# Altium footprint library micro-intel.PCBLIB: 48 footprints (part 2 of 4)
Each footprint in its own frame and in the unit in brackets; x right, y up, seen from the top. Pads: shape width x height; smd on the part's side, far side on the other; paste and mask are expansions set on the pad; w line width, h text height; cw(c..) or ccw(c..) is an arc to the next point about the centre after c.
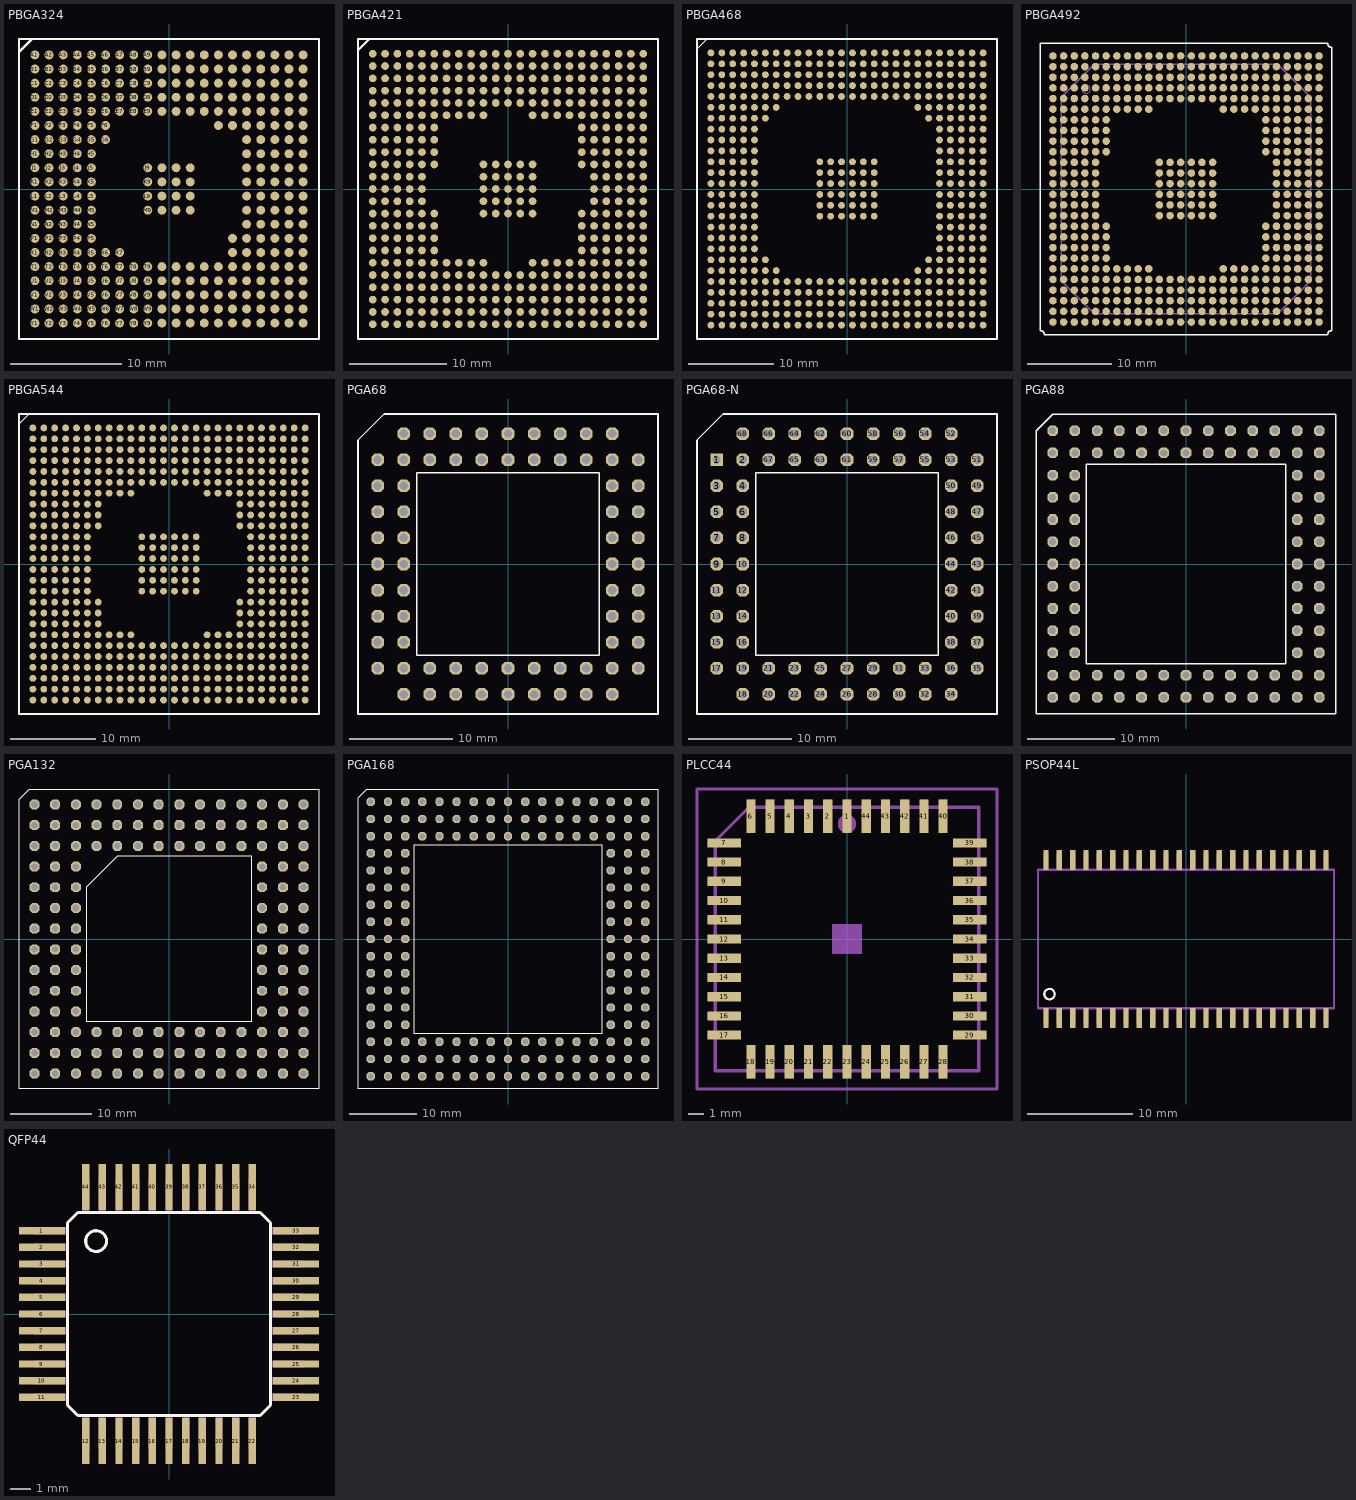
[diagram p1: the footprints below, top view; thin cyan lines are the x and y axes]

## PBGA324 [mil]
pads (324):
  rrect100% 31.5x31.5 smd: A1(-475,475) A2(-425,475) A3(-375,475) A4(-325,475) A5(-275,475) A6(-225,475) A7(-175,475) A8(-125,475) A9(-75,475) A10(-25,475) A11(25,475) A12(75,475) A13(125,475) A14(175,475) A15(225,475) A16(275,475) A17(325,475) A18(375,475) A19(425,475) A20(475,475) B1(-475,425) B2(-425,425) B3(-375,425) B4(-325,425) B5(-275,425) B6(-225,425) B7(-175,425) B8(-125,425) B9(-75,425) B10(-25,425) B11(25,425) B12(75,425) B13(125,425) B14(175,425) B15(225,425) B16(275,425) B17(325,425) B18(375,425) B19(425,425) B20(475,425) C1(-475,375) C2(-425,375) C3(-375,375) C4(-325,375) C5(-275,375) C6(-225,375) C7(-175,375) C8(-125,375) C9(-75,375) C10(-25,375) C11(25,375) C12(75,375) C13(125,375) C14(175,375) C15(225,375) C16(275,375) C17(325,375) C18(375,375) C19(425,375) C20(475,375) D1(-475,325) D2(-425,325) D3(-375,325) D4(-325,325) D5(-275,325) D6(-225,325) D7(-175,325) D8(-125,325) D9(-75,325) D10(-25,325) D11(25,325) D12(75,325) D13(125,325) D14(175,325) D15(225,325) D16(275,325) D17(325,325) D18(375,325) D19(425,325) D20(475,325) E1(-475,275) E2(-425,275) E3(-375,275) E4(-325,275) E5(-275,275) E6(-225,275) E7(-175,275) E8(-125,275) E9(-75,275) E10(-25,275) E11(25,275) E12(75,275) E13(125,275) E14(175,275) E15(225,275) E16(275,275) E17(325,275) E18(375,275) E19(425,275) E20(475,275) F1(-475,225) F2(-425,225) F3(-375,225) F4(-325,225) F5(-275,225) F6(-225,225) F14(175,225) F15(225,225) F16(275,225) F17(325,225) F18(375,225) F19(425,225) F20(475,225) G1(-475,175) G2(-425,175) G3(-375,175) G4(-325,175) G5(-275,175) G6(-225,175) G16(275,175) G17(325,175) G18(375,175) G19(425,175) G20(475,175) H1(-475,125) H2(-425,125) H3(-375,125) H4(-325,125) H5(-275,125) H16(275,125) H17(325,125) H18(375,125) H19(425,125) H20(475,125) J1(-475,75) J2(-425,75) J3(-375,75) J4(-325,75) J5(-275,75) J9(-75,75) J10(-25,75) J11(25,75) J12(75,75) J16(275,75) J17(325,75) J18(375,75) J19(425,75) J20(475,75) K1(-475,25) K2(-425,25) K3(-375,25) K4(-325,25) K5(-275,25) K9(-75,25) K10(-25,25) K11(25,25) K12(75,25) K16(275,25) K17(325,25) K18(375,25) K19(425,25) K20(475,25) L1(-475,-25) L2(-425,-25) L3(-375,-25) L4(-325,-25) L5(-275,-25) L9(-75,-25) L10(-25,-25) L11(25,-25) L12(75,-25) L16(275,-25) L17(325,-25) L18(375,-25) L19(425,-25) L20(475,-25) M1(-475,-75) M2(-425,-75) M3(-375,-75) M4(-325,-75) M5(-275,-75) M9(-75,-75) M10(-25,-75) M11(25,-75) M12(75,-75) M16(275,-75) M17(325,-75) M18(375,-75) M19(425,-75) M20(475,-75) N1(-475,-125) N2(-425,-125) N3(-375,-125) N4(-325,-125) N5(-275,-125) N16(275,-125) N17(325,-125) N18(375,-125) N19(425,-125) N20(475,-125) P1(-475,-175) P2(-425,-175) P3(-375,-175) P4(-325,-175) P5(-275,-175) P15(225,-175) P16(275,-175) P17(325,-175) P18(375,-175) P19(425,-175) P20(475,-175) R1(-475,-225) R2(-425,-225) R3(-375,-225) R4(-325,-225) R5(-275,-225) R6(-225,-225) R7(-175,-225) R15(225,-225) R16(275,-225) R17(325,-225) R18(375,-225) R19(425,-225) R20(475,-225) T1(-475,-275) T2(-425,-275) T3(-375,-275) T4(-325,-275) T5(-275,-275) T6(-225,-275) T7(-175,-275) T8(-125,-275) T9(-75,-275) T10(-25,-275) T11(25,-275) T12(75,-275) T13(125,-275) T14(175,-275) T15(225,-275) T16(275,-275) T17(325,-275) T18(375,-275) T19(425,-275) T20(475,-275) U1(-475,-325) U2(-425,-325) U3(-375,-325) U4(-325,-325) U5(-275,-325) U6(-225,-325) U7(-175,-325) U8(-125,-325) U9(-75,-325) U10(-25,-325) U11(25,-325) U12(75,-325) U13(125,-325) U14(175,-325) U15(225,-325) U16(275,-325) U17(325,-325) U18(375,-325) U19(425,-325) U20(475,-325) V1(-475,-375) V2(-425,-375) V3(-375,-375) V4(-325,-375) V5(-275,-375) V6(-225,-375) V7(-175,-375) V8(-125,-375) V9(-75,-375) V10(-25,-375) V11(25,-375) V12(75,-375) V13(125,-375) V14(175,-375) V15(225,-375) V16(275,-375) V17(325,-375) V18(375,-375) V19(425,-375) V20(475,-375) W1(-475,-425) W2(-425,-425) W3(-375,-425) W4(-325,-425) W5(-275,-425) W6(-225,-425) W7(-175,-425) W8(-125,-425) W9(-75,-425) W10(-25,-425) W11(25,-425) W12(75,-425) W13(125,-425) W14(175,-425) W15(225,-425) W16(275,-425) W17(325,-425) W18(375,-425) W19(425,-425) W20(475,-425) Y1(-475,-475) Y2(-425,-475) Y3(-375,-475) Y4(-325,-475) Y5(-275,-475) Y6(-225,-475) Y7(-175,-475) Y8(-125,-475) Y9(-75,-475) Y10(-25,-475) Y11(25,-475) Y12(75,-475) Y13(125,-475) Y14(175,-475) Y15(225,-475) Y16(275,-475) Y17(325,-475) Y18(375,-475) Y19(425,-475) Y20(475,-475)
Top Overlay:
  lines w8: -531.43,485.43 -531.43,531.43 -485.43,531.43 ; -531.43,485.43 -531.43,-531.43 531.43,-531.43 531.43,531.43 -485.43,531.43 ; -531.43,485.43 -485.43,531.43
Top Solder:
  drawing of 324 lines, arcs and shapes, not listed

## PBGA421 [mil]
pads (421):
  rrect100% 31.5x31.5 smd: A1(-550,550) A2(-500,550) A3(-450,550) A4(-400,550) A5(-350,550) A6(-300,550) A7(-250,550) A8(-200,550) A9(-150,550) A10(-100,550) A11(-50,550) A12(0,550) A13(50,550) A14(100,550) A15(150,550) A16(200,550) A17(250,550) A18(300,550) A19(350,550) A20(400,550) A21(450,550) A22(500,550) A23(550,550) AA1(-550,-450) AA2(-500,-450) AA3(-450,-450) AA4(-400,-450) AA5(-350,-450) AA6(-300,-450) AA7(-250,-450) AA8(-200,-450) AA9(-150,-450) AA10(-100,-450) AA11(-50,-450) AA12(0,-450) AA13(50,-450) AA14(100,-450) AA15(150,-450) AA16(200,-450) AA17(250,-450) AA18(300,-450) AA19(350,-450) AA20(400,-450) AA21(450,-450) AA22(500,-450) AA23(550,-450) AB1(-550,-500) AB2(-500,-500) AB3(-450,-500) AB4(-400,-500) AB5(-350,-500) AB6(-300,-500) AB7(-250,-500) AB8(-200,-500) AB9(-150,-500) AB10(-100,-500) AB11(-50,-500) AB12(0,-500) AB13(50,-500) AB14(100,-500) AB15(150,-500) AB16(200,-500) AB17(250,-500) AB18(300,-500) AB19(350,-500) AB20(400,-500) AB21(450,-500) AB22(500,-500) AB23(550,-500) AC1(-550,-550) AC2(-500,-550) AC3(-450,-550) AC4(-400,-550) AC5(-350,-550) AC6(-300,-550) AC7(-250,-550) AC8(-200,-550) AC9(-150,-550) AC10(-100,-550) AC11(-50,-550) AC12(0,-550) AC13(50,-550) AC14(100,-550) AC15(150,-550) AC16(200,-550) AC17(250,-550) AC18(300,-550) AC19(350,-550) AC20(400,-550) AC21(450,-550) AC22(500,-550) AC23(550,-550) B1(-550,500) B2(-500,500) B3(-450,500) B4(-400,500) B5(-350,500) B6(-300,500) B7(-250,500) B8(-200,500) B9(-150,500) B10(-100,500) B11(-50,500) B12(0,500) B13(50,500) B14(100,500) B15(150,500) B16(200,500) B17(250,500) B18(300,500) B19(350,500) B20(400,500) B21(450,500) B22(500,500) B23(550,500) C1(-550,450) C2(-500,450) C3(-450,450) C4(-400,450) C5(-350,450) C6(-300,450) C7(-250,450) C8(-200,450) C9(-150,450) C10(-100,450) C11(-50,450) C12(0,450) C13(50,450) C14(100,450) C15(150,450) C16(200,450) C17(250,450) C18(300,450) C19(350,450) C20(400,450) C21(450,450) C22(500,450) C23(550,450) D1(-550,400) D2(-500,400) D3(-450,400) D4(-400,400) D5(-350,400) D6(-300,400) D7(-250,400) D8(-200,400) D9(-150,400) D10(-100,400) D11(-50,400) D12(0,400) D13(50,400) D14(100,400) D15(150,400) D16(200,400) D17(250,400) D18(300,400) D19(350,400) D20(400,400) D21(450,400) D22(500,400) D23(550,400) E1(-550,350) E2(-500,350) E3(-450,350) E4(-400,350) E5(-350,350) E6(-300,350) E7(-250,350) E8(-200,350) E9(-150,350) E10(-100,350) E11(-50,350) E12(0,350) E13(50,350) E14(100,350) E15(150,350) E16(200,350) E17(250,350) E18(300,350) E19(350,350) E20(400,350) E21(450,350) E22(500,350) E23(550,350) F1(-550,300) F2(-500,300) F3(-450,300) F4(-400,300) F5(-350,300) F6(-300,300) F7(-250,300) F8(-200,300) F9(-150,300) F10(-100,300) F14(100,300) F15(150,300) F16(200,300) F17(250,300) F18(300,300) F19(350,300) F20(400,300) F21(450,300) F22(500,300) F23(550,300) G1(-550,250) G2(-500,250) G3(-450,250) G4(-400,250) G5(-350,250) G6(-300,250) G18(300,250) G19(350,250) G20(400,250) G21(450,250) G22(500,250) G23(550,250) H1(-550,200) H2(-500,200) H3(-450,200) H4(-400,200) H5(-350,200) H6(-300,200) H18(300,200) H19(350,200) H20(400,200) H21(450,200) H22(500,200) H23(550,200) J1(-550,150) J2(-500,150) J3(-450,150) J4(-400,150) J5(-350,150) J6(-300,150) J18(300,150) J19(350,150) J20(400,150) J21(450,150) J22(500,150) J23(550,150) K1(-550,100) K2(-500,100) K3(-450,100) K4(-400,100) K5(-350,100) K6(-300,100) K10(-100,100) K11(-50,100) K12(0,100) K13(50,100) K14(100,100) K18(300,100) K19(350,100) K20(400,100) K21(450,100) K22(500,100) K23(550,100) L1(-550,50) L2(-500,50) L3(-450,50) L4(-400,50) L5(-350,50) L10(-100,50) L11(-50,50) L12(0,50) L13(50,50) L14(100,50) L19(350,50) L20(400,50) L21(450,50) L22(500,50) L23(550,50) M1(-550,0) M2(-500,0) M3(-450,0) M4(-400,0) M5(-350,0) M10(-100,0) M11(-50,0) M12(0,0) M13(50,0) M14(100,0) M19(350,0) M20(400,0) M21(450,0) M22(500,0) M23(550,0) N1(-550,-50) N2(-500,-50) N3(-450,-50) N4(-400,-50) N5(-350,-50) N10(-100,-50) N11(-50,-50) N12(0,-50) N13(50,-50) N14(100,-50) N19(350,-50) N20(400,-50) N21(450,-50) N22(500,-50) N23(550,-50) P1(-550,-100) P2(-500,-100) P3(-450,-100) P4(-400,-100) P5(-350,-100) P6(-300,-100) P10(-100,-100) P11(-50,-100) P12(0,-100) P13(50,-100) P14(100,-100) P18(300,-100) P19(350,-100) P20(400,-100) P21(450,-100) P22(500,-100) P23(550,-100) R1(-550,-150) R2(-500,-150) R3(-450,-150) R4(-400,-150) R5(-350,-150) R6(-300,-150) R18(300,-150) R19(350,-150) R20(400,-150) R21(450,-150) R22(500,-150) R23(550,-150) T1(-550,-200) T2(-500,-200) T3(-450,-200) T4(-400,-200) T5(-350,-200) T6(-300,-200) T18(300,-200) T19(350,-200) T20(400,-200) T21(450,-200) T22(500,-200) T23(550,-200) U1(-550,-250) U2(-500,-250) U3(-450,-250) U4(-400,-250) U5(-350,-250) U6(-300,-250) U18(300,-250) U19(350,-250) U20(400,-250) U21(450,-250) U22(500,-250) U23(550,-250) V1(-550,-300) V2(-500,-300) V3(-450,-300) V4(-400,-300) V5(-350,-300) V6(-300,-300) V7(-250,-300) V8(-200,-300) V9(-150,-300) V10(-100,-300) V14(100,-300) V15(150,-300) V16(200,-300) V17(250,-300) V18(300,-300) V19(350,-300) V20(400,-300) V21(450,-300) V22(500,-300) V23(550,-300) W1(-550,-350) W2(-500,-350) W3(-450,-350) W4(-400,-350) W5(-350,-350) W6(-300,-350) W7(-250,-350) W8(-200,-350) W9(-150,-350) W10(-100,-350) W11(-50,-350) W12(0,-350) W13(50,-350) W14(100,-350) W15(150,-350) W16(200,-350) W17(250,-350) W18(300,-350) W19(350,-350) W20(400,-350) W21(450,-350) W22(500,-350) W23(550,-350) Y1(-550,-400) Y2(-500,-400) Y3(-450,-400) Y4(-400,-400) Y5(-350,-400) Y6(-300,-400) Y7(-250,-400) Y8(-200,-400) Y9(-150,-400) Y10(-100,-400) Y11(-50,-400) Y12(0,-400) Y13(50,-400) Y14(100,-400) Y15(150,-400) Y16(200,-400) Y17(250,-400) Y18(300,-400) Y19(350,-400) Y20(400,-400) Y21(450,-400) Y22(500,-400) Y23(550,-400)
Top Overlay:
  lines w8: -610.17,564.17 -610.17,610.17 -564.17,610.17 ; -610.17,564.17 -610.17,-610.17 610.17,-610.17 610.17,610.17 -564.17,610.17 ; -610.17,564.17 -564.17,610.17
Top Solder:
  drawing of 421 lines, arcs and shapes, not listed

## PBGA468 [mil]
pads (468):
  rrect100% 31.5x31.5 smd: A1(-625,625) A2(-575,625) A3(-525,625) A4(-475,625) A5(-425,625) A6(-375,625) A7(-325,625) A8(-275,625) A9(-225,625) A10(-175,625) A11(-125,625) A12(-75,625) A13(-25,625) A14(25,625) A15(75,625) A16(125,625) A17(175,625) A18(225,625) A19(275,625) A20(325,625) A21(375,625) A22(425,625) A23(475,625) A24(525,625) A25(575,625) A26(625,625) AA1(-625,-375) AA2(-575,-375) AA3(-525,-375) AA4(-475,-375) AA5(-425,-375) AA6(-375,-375) AA7(-325,-375) AA20(325,-375) AA21(375,-375) AA22(425,-375) AA23(475,-375) AA24(525,-375) AA25(575,-375) AA26(625,-375) AB1(-625,-425) AB2(-575,-425) AB3(-525,-425) AB4(-475,-425) AB5(-425,-425) AB6(-375,-425) AB7(-325,-425) AB8(-275,-425) AB9(-225,-425) AB10(-175,-425) AB11(-125,-425) AB12(-75,-425) AB13(-25,-425) AB14(25,-425) AB15(75,-425) AB16(125,-425) AB17(175,-425) AB18(225,-425) AB19(275,-425) AB20(325,-425) AB21(375,-425) AB22(425,-425) AB23(475,-425) AB24(525,-425) AB25(575,-425) AB26(625,-425) AC1(-625,-475) AC2(-575,-475) AC3(-525,-475) AC4(-475,-475) AC5(-425,-475) AC6(-375,-475) AC7(-325,-475) AC8(-275,-475) AC9(-225,-475) AC10(-175,-475) AC11(-125,-475) AC12(-75,-475) AC13(-25,-475) AC14(25,-475) AC15(75,-475) AC16(125,-475) AC17(175,-475) AC18(225,-475) AC19(275,-475) AC20(325,-475) AC21(375,-475) AC22(425,-475) AC23(475,-475) AC24(525,-475) AC25(575,-475) AC26(625,-475) AD1(-625,-525) AD2(-575,-525) AD3(-525,-525) AD4(-475,-525) AD5(-425,-525) AD6(-375,-525) AD7(-325,-525) AD8(-275,-525) AD9(-225,-525) AD10(-175,-525) AD11(-125,-525) AD12(-75,-525) AD13(-25,-525) AD14(25,-525) AD15(75,-525) AD16(125,-525) AD17(175,-525) AD18(225,-525) AD19(275,-525) AD20(325,-525) AD21(375,-525) AD22(425,-525) AD23(475,-525) AD24(525,-525) AD25(575,-525) AD26(625,-525) AE1(-625,-575) AE2(-575,-575) AE3(-525,-575) AE4(-475,-575) AE5(-425,-575) AE6(-375,-575) AE7(-325,-575) AE8(-275,-575) AE9(-225,-575) AE10(-175,-575) AE11(-125,-575) AE12(-75,-575) AE13(-25,-575) AE14(25,-575) AE15(75,-575) AE16(125,-575) AE17(175,-575) AE18(225,-575) AE19(275,-575) AE20(325,-575) AE21(375,-575) AE22(425,-575) AE23(475,-575) AE24(525,-575) AE25(575,-575) AE26(625,-575) AF1(-625,-625) AF2(-575,-625) AF3(-525,-625) AF4(-475,-625) AF5(-425,-625) AF6(-375,-625) AF7(-325,-625) AF8(-275,-625) AF9(-225,-625) AF10(-175,-625) AF11(-125,-625) AF12(-75,-625) AF13(-25,-625) AF14(25,-625) AF15(75,-625) AF16(125,-625) AF17(175,-625) AF18(225,-625) AF19(275,-625) AF20(325,-625) AF21(375,-625) AF22(425,-625) AF23(475,-625) AF24(525,-625) AF25(575,-625) AF26(625,-625) B1(-625,575) B2(-575,575) B3(-525,575) B4(-475,575) B5(-425,575) B6(-375,575) B7(-325,575) B8(-275,575) B9(-225,575) B10(-175,575) B11(-125,575) B12(-75,575) B13(-25,575) B14(25,575) B15(75,575) B16(125,575) B17(175,575) B18(225,575) B19(275,575) B20(325,575) B21(375,575) B22(425,575) B23(475,575) B24(525,575) B25(575,575) B26(625,575) C1(-625,525) C2(-575,525) C3(-525,525) C4(-475,525) C5(-425,525) C6(-375,525) C7(-325,525) C8(-275,525) C9(-225,525) C10(-175,525) C11(-125,525) C12(-75,525) C13(-25,525) C14(25,525) C15(75,525) C16(125,525) C17(175,525) C18(225,525) C19(275,525) C20(325,525) C21(375,525) C22(425,525) C23(475,525) C24(525,525) C25(575,525) C26(625,525) D1(-625,475) D2(-575,475) D3(-525,475) D4(-475,475) D5(-425,475) D6(-375,475) D7(-325,475) D8(-275,475) D9(-225,475) D10(-175,475) D11(-125,475) D12(-75,475) D13(-25,475) D14(25,475) D15(75,475) D16(125,475) D17(175,475) D18(225,475) D19(275,475) D20(325,475) D21(375,475) D22(425,475) D23(475,475) D24(525,475) D25(575,475) D26(625,475) E1(-625,425) E2(-575,425) E3(-525,425) E4(-475,425) E5(-425,425) E6(-375,425) E7(-325,425) E8(-275,425) E9(-225,425) E10(-175,425) E11(-125,425) E12(-75,425) E13(-25,425) E14(25,425) E15(75,425) E16(125,425) E17(175,425) E18(225,425) E19(275,425) E20(325,425) E21(375,425) E22(425,425) E23(475,425) E24(525,425) E25(575,425) E26(625,425) F1(-625,375) F2(-575,375) F3(-525,375) F4(-475,375) F5(-425,375) F6(-375,375) F7(-325,375) F20(325,375) F21(375,375) F22(425,375) F23(475,375) F24(525,375) F25(575,375) F26(625,375) G1(-625,325) G2(-575,325) G3(-525,325) G4(-475,325) G5(-425,325) G6(-375,325) G21(375,325) G22(425,325) G23(475,325) G24(525,325) G25(575,325) G26(625,325) H1(-625,275) H2(-575,275) H3(-525,275) H4(-475,275) H5(-425,275) H22(425,275) H23(475,275) H24(525,275) H25(575,275) H26(625,275) J1(-625,225) J2(-575,225) J3(-525,225) J4(-475,225) J5(-425,225) J22(425,225) J23(475,225) J24(525,225) J25(575,225) J26(625,225) K1(-625,175) K2(-575,175) K3(-525,175) K4(-475,175) K5(-425,175) K22(425,175) K23(475,175) K24(525,175) K25(575,175) K26(625,175) L1(-625,125) L2(-575,125) L3(-525,125) L4(-475,125) L5(-425,125) L11(-125,125) L12(-75,125) L13(-25,125) L14(25,125) L15(75,125) L16(125,125) L22(425,125) L23(475,125) L24(525,125) L25(575,125) L26(625,125) M1(-625,75) M2(-575,75) M3(-525,75) M4(-475,75) M5(-425,75) M11(-125,75) M12(-75,75) M13(-25,75) M14(25,75) M15(75,75) M16(125,75) M22(425,75) M23(475,75) M24(525,75) M25(575,75) M26(625,75) N1(-625,25) N2(-575,25) N3(-525,25) N4(-475,25) N5(-425,25) N11(-125,25) N12(-75,25) N13(-25,25) N14(25,25) N15(75,25) N16(125,25) N22(425,25) N23(475,25) N24(525,25) N25(575,25) N26(625,25) P1(-625,-25) P2(-575,-25) P3(-525,-25) P4(-475,-25) P5(-425,-25) P11(-125,-25) P12(-75,-25) P13(-25,-25) P14(25,-25) P15(75,-25) P16(125,-25) P22(425,-25) P23(475,-25) P24(525,-25) P25(575,-25) P26(625,-25) R1(-625,-75) R2(-575,-75) R3(-525,-75) R4(-475,-75) R5(-425,-75) R11(-125,-75) R12(-75,-75) R13(-25,-75) R14(25,-75) R15(75,-75) R16(125,-75) R22(425,-75) R23(475,-75) R24(525,-75) R25(575,-75) R26(625,-75) T1(-625,-125) T2(-575,-125) T3(-525,-125) T4(-475,-125) T5(-425,-125) T11(-125,-125) T12(-75,-125) T13(-25,-125) T14(25,-125) T15(75,-125) T16(125,-125) T22(425,-125) T23(475,-125) T24(525,-125) T25(575,-125) T26(625,-125) U1(-625,-175) U2(-575,-175) U3(-525,-175) U4(-475,-175) U5(-425,-175) U22(425,-175) U23(475,-175) U24(525,-175) U25(575,-175) U26(625,-175) V1(-625,-225) V2(-575,-225) V3(-525,-225) V4(-475,-225) V5(-425,-225) V22(425,-225) V23(475,-225) V24(525,-225) V25(575,-225) V26(625,-225) W1(-625,-275) W2(-575,-275) W3(-525,-275) W4(-475,-275) W5(-425,-275) W22(425,-275) W23(475,-275) W24(525,-275) W25(575,-275) W26(625,-275) Y1(-625,-325) Y2(-575,-325) Y3(-525,-325) Y4(-475,-325) Y5(-425,-325) Y6(-375,-325) Y21(375,-325) Y22(425,-325) Y23(475,-325) Y24(525,-325) Y25(575,-325) Y26(625,-325)
Top Overlay:
  lines w8: -688.91,642.91 -688.91,688.91 -642.91,688.91 ; -688.91,642.91 -688.91,-688.91 688.91,-688.91 688.91,688.91 -642.91,688.91 ; -688.91,642.91 -642.91,688.91
Top Solder:
  drawing of 468 lines, arcs and shapes, not listed

## PBGA492 [mil]
pads (492):
  rrect100% 35.43x35.43 smd: A1(-625,625) A2(-575,625) A3(-525,625) A4(-475,625) A5(-425,625) A6(-375,625) A7(-325,625) A8(-275,625) A9(-225,625) A10(-175,625) A11(-125,625) A12(-75,625) A13(-25,625) A14(25,625) A15(75,625) A16(125,625) A17(175,625) A18(225,625) A19(275,625) A20(325,625) A21(375,625) A22(425,625) A23(475,625) A24(525,625) A25(575,625) A26(625,625) AA1(-625,-375) AA2(-575,-375) AA3(-525,-375) AA4(-475,-375) AA5(-425,-375) AA6(-375,-375) AA7(-325,-375) AA8(-275,-375) AA9(-225,-375) AA10(-175,-375) AA17(175,-375) AA18(225,-375) AA19(275,-375) AA20(325,-375) AA21(375,-375) AA22(425,-375) AA23(475,-375) AA24(525,-375) AA25(575,-375) AA26(625,-375) AB1(-625,-425) AB2(-575,-425) AB3(-525,-425) AB4(-475,-425) AB5(-425,-425) AB6(-375,-425) AB7(-325,-425) AB8(-275,-425) AB9(-225,-425) AB10(-175,-425) AB11(-125,-425) AB12(-75,-425) AB13(-25,-425) AB14(25,-425) AB15(75,-425) AB16(125,-425) AB17(175,-425) AB18(225,-425) AB19(275,-425) AB20(325,-425) AB21(375,-425) AB22(425,-425) AB23(475,-425) AB24(525,-425) AB25(575,-425) AB26(625,-425) AC1(-625,-475) AC2(-575,-475) AC3(-525,-475) AC4(-475,-475) AC5(-425,-475) AC6(-375,-475) AC7(-325,-475) AC8(-275,-475) AC9(-225,-475) AC10(-175,-475) AC11(-125,-475) AC12(-75,-475) AC13(-25,-475) AC14(25,-475) AC15(75,-475) AC16(125,-475) AC17(175,-475) AC18(225,-475) AC19(275,-475) AC20(325,-475) AC21(375,-475) AC22(425,-475) AC23(475,-475) AC24(525,-475) AC25(575,-475) AC26(625,-475) AD1(-625,-525) AD2(-575,-525) AD3(-525,-525) AD4(-475,-525) AD5(-425,-525) AD6(-375,-525) AD7(-325,-525) AD8(-275,-525) AD9(-225,-525) AD10(-175,-525) AD11(-125,-525) AD12(-75,-525) AD13(-25,-525) AD14(25,-525) AD15(75,-525) AD16(125,-525) AD17(175,-525) AD18(225,-525) AD19(275,-525) AD20(325,-525) AD21(375,-525) AD22(425,-525) AD23(475,-525) AD24(525,-525) AD25(575,-525) AD26(625,-525) AE1(-625,-575) AE2(-575,-575) AE3(-525,-575) AE4(-475,-575) AE5(-425,-575) AE6(-375,-575) AE7(-325,-575) AE8(-275,-575) AE9(-225,-575) AE10(-175,-575) AE11(-125,-575) AE12(-75,-575) AE13(-25,-575) AE14(25,-575) AE15(75,-575) AE16(125,-575) AE17(175,-575) AE18(225,-575) AE19(275,-575) AE20(325,-575) AE21(375,-575) AE22(425,-575) AE23(475,-575) AE24(525,-575) AE25(575,-575) AE26(625,-575) AF1(-625,-625) AF2(-575,-625) AF3(-525,-625) AF4(-475,-625) AF5(-425,-625) AF6(-375,-625) AF7(-325,-625) AF8(-275,-625) AF9(-225,-625) AF10(-175,-625) AF11(-125,-625) AF12(-75,-625) AF13(-25,-625) AF14(25,-625) AF15(75,-625) AF16(125,-625) AF17(175,-625) AF18(225,-625) AF19(275,-625) AF20(325,-625) AF21(375,-625) AF22(425,-625) AF23(475,-625) AF24(525,-625) AF25(575,-625) AF26(625,-625) B1(-625,575) B2(-575,575) B3(-525,575) B4(-475,575) B5(-425,575) B6(-375,575) B7(-325,575) B8(-275,575) B9(-225,575) B10(-175,575) B11(-125,575) B12(-75,575) B13(-25,575) B14(25,575) B15(75,575) B16(125,575) B17(175,575) B18(225,575) B19(275,575) B20(325,575) B21(375,575) B22(425,575) B23(475,575) B24(525,575) B25(575,575) B26(625,575) C1(-625,525) C2(-575,525) C3(-525,525) C4(-475,525) C5(-425,525) C6(-375,525) C7(-325,525) C8(-275,525) C9(-225,525) C10(-175,525) C11(-125,525) C12(-75,525) C13(-25,525) C14(25,525) C15(75,525) C16(125,525) C17(175,525) C18(225,525) C19(275,525) C20(325,525) C21(375,525) C22(425,525) C23(475,525) C24(525,525) C25(575,525) C26(625,525) D1(-625,475) D2(-575,475) D3(-525,475) D4(-475,475) D5(-425,475) D6(-375,475) D7(-325,475) D8(-275,475) D9(-225,475) D10(-175,475) D11(-125,475) D12(-75,475) D13(-25,475) D14(25,475) D15(75,475) D16(125,475) D17(175,475) D18(225,475) D19(275,475) D20(325,475) D21(375,475) D22(425,475) D23(475,475) D24(525,475) D25(575,475) D26(625,475) E1(-625,425) E2(-575,425) E3(-525,425) E4(-475,425) E5(-425,425) E6(-375,425) E7(-325,425) E8(-275,425) E9(-225,425) E10(-175,425) E11(-125,425) E12(-75,425) E13(-25,425) E14(25,425) E15(75,425) E16(125,425) E17(175,425) E18(225,425) E19(275,425) E20(325,425) E21(375,425) E22(425,425) E23(475,425) E24(525,425) E25(575,425) E26(625,425) F1(-625,375) F2(-575,375) F3(-525,375) F4(-475,375) F5(-425,375) F6(-375,375) F7(-325,375) F8(-275,375) F9(-225,375) F10(-175,375) F17(175,375) F18(225,375) F19(275,375) F20(325,375) F21(375,375) F22(425,375) F23(475,375) F24(525,375) F25(575,375) F26(625,375) G1(-625,325) G2(-575,325) G3(-525,325) G4(-475,325) G5(-425,325) G6(-375,325) G21(375,325) G22(425,325) G23(475,325) G24(525,325) G25(575,325) G26(625,325) H1(-625,275) H2(-575,275) H3(-525,275) H4(-475,275) H5(-425,275) H6(-375,275) H21(375,275) H22(425,275) H23(475,275) H24(525,275) H25(575,275) H26(625,275) J1(-625,225) J2(-575,225) J3(-525,225) J4(-475,225) J5(-425,225) J6(-375,225) J21(375,225) J22(425,225) J23(475,225) J24(525,225) J25(575,225) J26(625,225) K1(-625,175) K2(-575,175) K3(-525,175) K4(-475,175) K5(-425,175) K6(-375,175) K21(375,175) K22(425,175) K23(475,175) K24(525,175) K25(575,175) K26(625,175) L1(-625,125) L2(-575,125) L3(-525,125) L4(-475,125) L5(-425,125) L11(-125,125) L12(-75,125) L13(-25,125) L14(25,125) L15(75,125) L16(125,125) L22(425,125) L23(475,125) L24(525,125) L25(575,125) L26(625,125) M1(-625,75) M2(-575,75) M3(-525,75) M4(-475,75) M5(-425,75) M11(-125,75) M12(-75,75) M13(-25,75) M14(25,75) M15(75,75) M16(125,75) M22(425,75) M23(475,75) M24(525,75) M25(575,75) M26(625,75) N1(-625,25) N2(-575,25) N3(-525,25) N4(-475,25) N5(-425,25) N11(-125,25) N12(-75,25) N13(-25,25) N14(25,25) N15(75,25) N16(125,25) N22(425,25) N23(475,25) N24(525,25) N25(575,25) N26(625,25) P1(-625,-25) P2(-575,-25) P3(-525,-25) P4(-475,-25) P5(-425,-25) P11(-125,-25) P12(-75,-25) P13(-25,-25) P14(25,-25) P15(75,-25) P16(125,-25) P22(425,-25) P23(475,-25) P24(525,-25) P25(575,-25) P26(625,-25) R1(-625,-75) R2(-575,-75) R3(-525,-75) R4(-475,-75) R5(-425,-75) R11(-125,-75) R12(-75,-75) R13(-25,-75) R14(25,-75) R15(75,-75) R16(125,-75) R22(425,-75) R23(475,-75) R24(525,-75) R25(575,-75) R26(625,-75) T1(-625,-125) T2(-575,-125) T3(-525,-125) T4(-475,-125) T5(-425,-125) T11(-125,-125) T12(-75,-125) T13(-25,-125) T14(25,-125) T15(75,-125) T16(125,-125) T22(425,-125) T23(475,-125) T24(525,-125) T25(575,-125) T26(625,-125) U1(-625,-175) U2(-575,-175) U3(-525,-175) U4(-475,-175) U5(-425,-175) U6(-375,-175) U21(375,-175) U22(425,-175) U23(475,-175) U24(525,-175) U25(575,-175) U26(625,-175) V1(-625,-225) V2(-575,-225) V3(-525,-225) V4(-475,-225) V5(-425,-225) V6(-375,-225) V21(375,-225) V22(425,-225) V23(475,-225) V24(525,-225) V25(575,-225) V26(625,-225) W1(-625,-275) W2(-575,-275) W3(-525,-275) W4(-475,-275) W5(-425,-275) W6(-375,-275) W21(375,-275) W22(425,-275) W23(475,-275) W24(525,-275) W25(575,-275) W26(625,-275) Y1(-625,-325) Y2(-575,-325) Y3(-525,-325) Y4(-475,-325) Y5(-425,-325) Y6(-375,-325) Y21(375,-325) Y22(425,-325) Y23(475,-325) Y24(525,-325) Y25(575,-325) Y26(625,-325)